# Altium integrated library 刘兴达Lib.IntLib: 614 symbols (part 4 of 4) (continued)
## TPS3305
designator U?, comment TPS3305-18D
DSP电源管理
footprint MSOP-8 (TSOP)
pins: 1 SE1, 2 SE2, 3 WDI, 4 GND, 5 ~{RESET}, 6 RESET, 7 ~{MR}, 8 VDD

## TPS3808
designator U?
DSP电源管理
footprint SOT23-6 (Max4173)
pins: 1 ~{RESET}, 2 GND, 3 ~{MR}, 4 CT, 5 SENSE, 6 VDD

## TPS5430
designator U?  (value not drawn)
开关稳压芯片
footprint POWERPARK SOP8
pins: 0 GND, 1 BOOT, 2 NC, 3 NC, 4 VSENSE, 5 ENA, 6 GND, 7 VIN, 8 PH

## TPS6213X
designator U?
DC-DC
footprint QFN-16 (QFN)
pins: 1 SW, 2 SW, 3 SW, 4 PG, 5 FB, 6 AGND, 7 FSW, 8 DEF, 9 SS/TR, 10 AVIN, 11 PVIN, 12 PVIN, 13 EN, 14 VOS, 15 PGND, 16 PGND, 17 PAD

## TPS6735
designator U?
负电压芯片
footprint SOIC-8
pins: 1 EN, 2 REF, 3 SS, 4 COMP, 5 FB, 6 GND, 7 OUT, 8 VCC

## TPS54160
designator U?
异步1.5A输出BUCK; Manufacturer_Part_Number: tps54160_dgq_10; GENERIC_PART_NUMBER: TPS54160; Vendor: Texas Instruments; PACKAGE_DESIGNATOR: DGQ; PIN_COUNT: 10; FAMILY_NAME: STEP-DOWN REGULATOR; INDUSTRY_STD_PKG_TYPE: MSOP-PowerPAD; Manufacturer: Texas Instruments; Datasheet_URL: http://www.ti.com/lit/gpn/TPS54160; Value: Value; Type: Type; RefDes: RefDes
footprint MSOP-10（with cooler）
pins: 1 BOOT (out), 2 VIN (in), 3 EN (in), 4 SS/TR (in), 5 RT/CLK (in), 6 PWRGD (out), 7 VSENSE (in), 8 COMP (out), 9 GND (power), 10 PH (in), EPAD

## TPS54360
designator U?
异步3A输出BUCK; Manufacturer_Part_Number: TPS54360DDAR; Vendor: Texas Instruments; Built_By: EMA_UL_Team; Copyright: Copyright (C) 2018 Accelerated Designs. All rights reserved; RefDes: RefDes; Type: DEV; Value: Value
footprint HSOIC8
pins: 1 BOOT (out), 2 VIN (in), 3 EN (in), 4 RT/CLK (in), 5 FB (in), 6 COMP (out), 7 GND (power), 8 SW (in), EPAD

## TPS55330
designator U?
升压
footprint QFN_16
pins: 1 SW, 2 VIN, 3 EN, 4 SS, 5 SYNC, 6 AGND, 7 COMP, 8 FB, 9 FREQ, 10 NC, 11 PGND, 12 PGND, 13 PGND, 14 NC, 15 SW, 16 SW, 17 PAD

## TPS61022
designator U?
0.5V 输入电压 8A 输出BOOST; Manufacturer: Texas Instruments; PartNumber: TPS61022RWUR; RefDes: RefDes; TYPE: TYPE; Value: Value
footprint VQFN-7
pins: 1 GND (power), 2 SW (power), 3 VOUT (power), 4 FB (in), 5 EN (in), 6 MODE (in), 7 VIN (power)

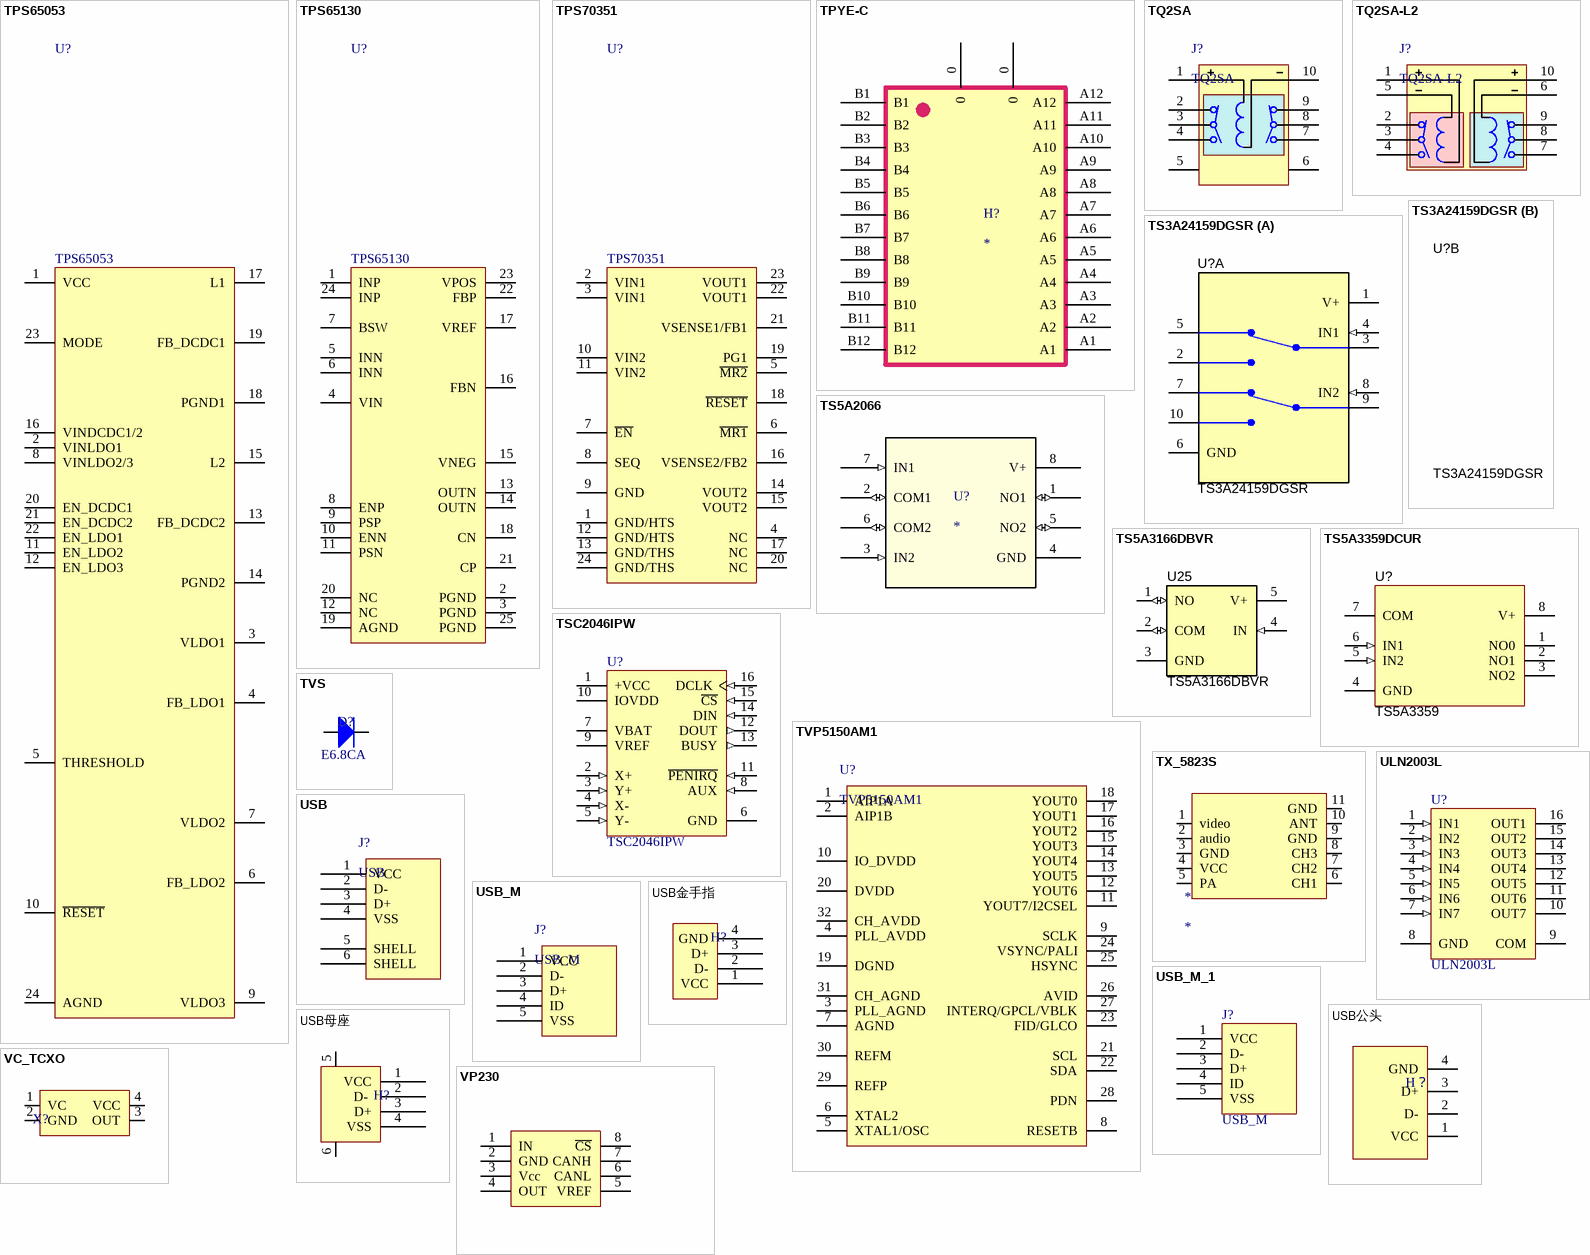
[diagram p27: symbols TPS65053 to VP230]

## TPS65053
designator U?
DSP电源芯片
footprint VQFN-24
pins: 1 VCC, 2 VINLDO1, 3 VLDO1, 4 FB_LDO1, 5 THRESHOLD, 6 FB_LDO2, 7 VLDO2, 8 VINLDO2/3, 9 VLDO3, 10 ~{RESET}, 11 EN_LDO2, 12 EN_LDO3, 13 FB_DCDC2, 14 PGND2, 15 L2, 16 VINDCDC1/2, 17 L1, 18 PGND1, 19 FB_DCDC1, 20 EN_DCDC1, 21 EN_DCDC2, 22 EN_LDO1, 23 MODE, 24 AGND, 25 GND hidden to GND

## TPS65130
designator U?
电源管理DC-DC
footprint VQFN-24
pins: 1 INP, 2 PGND, 3 PGND, 4 VIN, 5 INN, 6 INN, 7 BSW, 8 ENP, 9 PSP, 10 ENN, 11 PSN, 12 NC, 13 OUTN, 14 OUTN, 15 VNEG, 16 FBN, 17 VREF, 18 CN, 19 AGND, 20 NC, 21 CP, 22 FBP, 23 VPOS, 24 INP, 25 PGND

## TPS70351
designator U?
DSP电源芯片
footprint TSSOP-24P
pins: 1 GND/HTS, 2 VIN1, 3 VIN1, 4 NC, 5 ~{MR2}, 6 ~{MR1}, 7 ~{EN}, 8 SEQ, 9 GND, 10 VIN2, 11 VIN2, 12 GND/HTS, 13 GND/THS, 14 VOUT2, 15 VOUT2, 16 VSENSE2/FB2, 17 NC, 18 ~{RESET}, 19 PG1, 20 NC, 21 VSENSE1/FB1, 22 VOUT1, 23 VOUT1, 24 GND/THS, 25 GND hidden to GND

## TPYE-C
designator H?
footprint TYPE-C 24P
pins: 0, 0, A1, A2, A3, A4, A5, A6, A7, A8, A9, A10, A11, A12, B1, B2, B3, B4, B5, B6, B7, B8, B9, B10, B11, B12

## TQ2SA
designator J?
单通道继电器
footprint TQ2SA-SL (双继电器)
pins: 1, 2, 3, 4, 5, 6, 7, 8, 9, 10

## TQ2SA-L2
designator J?
双通道双稳态继电器
footprint TQ2SA-SL (双继电器)
pins: 1, 2, 3, 4, 5, 6, 7, 8, 9, 10

## TS3A24159DGSR
designator U?
模拟开关; PartNumber: TS3A24159DRCR; Manufacturer: Texas Instruments; SymbolCreator: Altium; SizeArea_mm2: 9; SizeAreaWB_mm2: 16; SizeX_mm: 3; SizeZ_mm: 1; CompType: IC; U/M: EA; SymbolVersion: 2016-05-18; PackageReference: DRC0010J; PackageDescription: VSON-10; MountType: SMT; SizeY_mm: 3; ComponentLink1Description: Datasheet Link; ComponentLink1URL: http://www.ti.com/lit/ds/symlink/ts3a24159.pdf; RoHS: Y; Publisher: Texas Instruments; LatestRevisionDate: 2016-08-29; Alternate Manufacturer: Texas Instruments
footprint MSOP-10 (TSSOP)
part A pins: 1 V+ (power), 2 NO1, 3 COM1, 4 IN1 (in), 5 NC1, 6 GND (power), 7 NC2, 8 IN2 (in), 9 COM2, 10 NO2

## TS5A2066
designator U?
PartNumber: TS5A2066DCUR; Manufacturer: Texas Instruments; RefDes: RefDes; Type: DEV; Value: Value; Copyright: Copyright (C) 2018 Accelerated Designs. All rights reserved
footprint VSSOP-8
pins: 1 NO1 (io), 2 COM1 (io), 3 IN2 (in), 4 GND (power), 5 NO2 (io), 6 COM2 (io), 7 IN1 (in), 8 V+ (power)

## TS5A3166DBVR
designator U25
模拟开关; PartNumber: TS5A3166DCKR; Manufacturer: Texas Instruments; SymbolCreator: x0208325; SizeArea_mm2: 4.2; SizeX_mm: 2.1; SizeY_mm: 2; SizeZ_mm: 1.1; CompType: IC; U/M: EA; SymbolVersion: 2016-1-28; PackageReference: DCK0005A; PackageDescription: SOT-5; MountType: SMT; ComponentLink1Description: Datasheet Link; ComponentLink1URL: http://www.ti.com/lit/ds/symlink/ts5a3166.pdf; RoHS: Y; Publisher: Texas Instruments; LatestRevisionDate: 2016-05-13; Alternate Manufacturer: Texas Instruments
footprint SOT23-5 (Max4173)
pins: 1 NO (io), 2 COM (io), 3 GND (power), 4 IN (in), 5 V+ (power)

## TS5A3359DCUR
designator U?, comment TS5A3359
模拟开关; PartNumber: TS5A3359DCUR; Alternate PartNumber: TS5A3359DCUT; Manufacturer: Texas Instruments; SymbolCreator: Altium; CompType: IC; U/M: EA; SymbolVersion: 2015-03-25; PackageReference: DCU0008A; MountType: SMT; ComponentLink1Description: Datasheet Link; ComponentLink1URL: http://www.ti.com/lit/ds/symlink/ts5a3359.pdf; RoHS: Y; Publisher: Texas Instruments; LatestRevisionDate: 2015-12-28; Alternate Manufacturer: Texas Instruments
footprint VSSOP-8
pins: 1 NO0, 2 NO1, 3 NO2, 4 GND (power), 5 IN2 (in), 6 IN1 (in), 7 COM, 8 V+ (power)

## TSC2046IPW
designator U?
触摸驱动芯片; Published: 6-Oct-2005; DatasheetVersion: Jan-2005; PackageVersion: Feb-1999; PackageReference: PW016; Publisher: Altium Limited; PackageDescription: Shrink Small Outline; 16 Leads; Body Width 4.4 mm; Pitch 0.65 mm; ComponentLink1Description: Manufacturer Link; ComponentLink1URL: http://focus.ti.com/docs/prod/folders/print/tsc2046.html; ComponentLink2Description: Datasheet; ComponentLink2URL: http://focus.ti.com/lit/ds/symlink/tcs2046.pdf
footprint PW016 (Shrink Small Outline; 16 Leads; Body Width 4.4 mm; Pitch 0.65 mm)
pins: 1 +VCC (power), 2 X+ (in), 3 Y+ (in), 4 X- (in), 5 Y- (in), 6 GND (power), 7 VBAT (power), 8 AUX (in), 9 VREF (power), 10 IOVDD (power), 11 ~{PENIRQ} (in), 12 DOUT (out), 13 BUSY (out), 14 DIN (in), 15 ~{CS} (in), 16 DCLK (in)

## TVP5150AM1
designator U?
视频解码芯片
footprint TQFP-32
pins: 1 AIP1A, 2 AIP1B, 3 PLL_AGND, 4 PLL_AVDD, 5 XTAL1/OSC, 6 XTAL2, 7 AGND, 8 RESETB, 9 SCLK, 10 IO_DVDD, 11 YOUT7/I2CSEL, 12 YOUT6, 13 YOUT5, 14 YOUT4, 15 YOUT3, 16 YOUT2, 17 YOUT1, 18 YOUT0, 19 DGND, 20 DVDD, 21 SCL, 22 SDA, 23 FID/GLCO, 24 VSYNC/PALI, 25 HSYNC, 26 AVID, 27 INTERQ/GPCL/VBLK, 28 PDN, 29 REFP, 30 REFM, 31 CH_AGND, 32 CH_AVDD

## TVS
designator D?  Type: E6.8CA  (hidden comment: TVS)
TVS保护; Published: 8-Jun-2000; LatestRevisionDate: 17-Jul-2002; LatestRevisionNote: Re-released for DXP Platform.; PackageDocument: Sep-1996; PackageReference: SMC; Publisher: Altium Limited; Code_JEDEC: DO-214-AB
footprint D-AXL (插件二极管)
footprint D-1206 (贴片二极管)
footprint D-SMA (贴片二极管)
footprint D-SMB (DO-214-AA/SMB; 2 C-Bend Leads; Body 5.3 x 3.6 mm, inc. leads (LxW))
pins: 1 A, 2 K

## TX_5823S
designator *
footprint TX_5823S (图传发射芯片)
pins: 1 video, 2 audio, 3 GND, 4 VCC, 5 PA, 6 CH1, 7 CH2, 8 CH3, 9 GND, 10 ANT, 11 GND

## ULN2003L
designator U?
驱动芯片; Published: 13-Oct-2000; LatestRevisionDate: 13-Apr-2006; LatestRevisionNote: IPC-7351 Footprint Added.; DatasheetVersion: 1998; PackageReference: L16; Publisher: Altium Limited; PackageDescription: 16-Pin Small Outline Integrated Circuit 1.27 mm Pitch; Code_JEDEC: MS-012-AC; Code_IPC: SOIC127P600-16; ComponentLink1Description: Manufacturer Link; ComponentLink1URL: http://www.allegromicro.com/
footprint SOIC-16
pins: 1 IN1 (in), 2 IN2 (in), 3 IN3 (in), 4 IN4 (in), 5 IN5 (in), 6 IN6 (in), 7 IN7 (in), 8 GND (power), 9 COM, 10 OUT7 (oc), 11 OUT6 (oc), 12 OUT5 (oc), 13 OUT4 (oc), 14 OUT3 (oc), 15 OUT2 (oc), 16 OUT1 (oc)

## USB
designator J?
USB接口
footprint USB_B1 (USB方孔)
footprint USB_A1
footprint USB_C1 (侧卧USB)
pins: 1 VCC, 2 D- , 3 D+, 4 VSS, 5 SHELL, 6 SHELL

## USB_M
designator J?
Micro/Mini USB
footprint USB_MICRO (USB方孔)
footprint USB/SM0.8-6H5 (Connector; USB2.0, Type B, SM; 5 Position; Right Angle)
pins: 1 VCC, 2 D- , 3 D+, 4 ID, 5 VSS

## USB_M_1
designator J?, comment USB_M
Micro/Mini USB
footprint MINI-USB-SMD_C105424
pins: 1 VCC, 2 D- , 3 D+, 4 ID, 5 VSS

## USB公头
designator H？  (value not drawn)
footprint USB公头
pins: 1 VCC, 2 D-, 3 D+, 4 GND

## USB母座
designator H?  (value not drawn)
footprint USB母座
footprint USB母座B
pins: 1 VCC, 2 D- , 3 D+, 4 VSS, 5, 6

## USB金手指
designator H?  (value not drawn)
footprint USB金手指
pins: 1 VCC, 2 D-, 3 D+, 4 GND

## VC_TCXO
designator X?
温控晶振
footprint OSC-5032-4P (5mm*3.2mm*0.8mm(长*宽*高)              淘宝ID:黄晶宝石)
pins: 1 VC, 2 GND, 3 OUT, 4 VCC

## VP230
designator U?  (value not drawn)
CAN 芯片
footprint VP230
pins: 1 IN, 2 GND, 3 Vcc, 4 OUT, 5 VREF, 6 CANL, 7 CANH, 8 ~{CS}

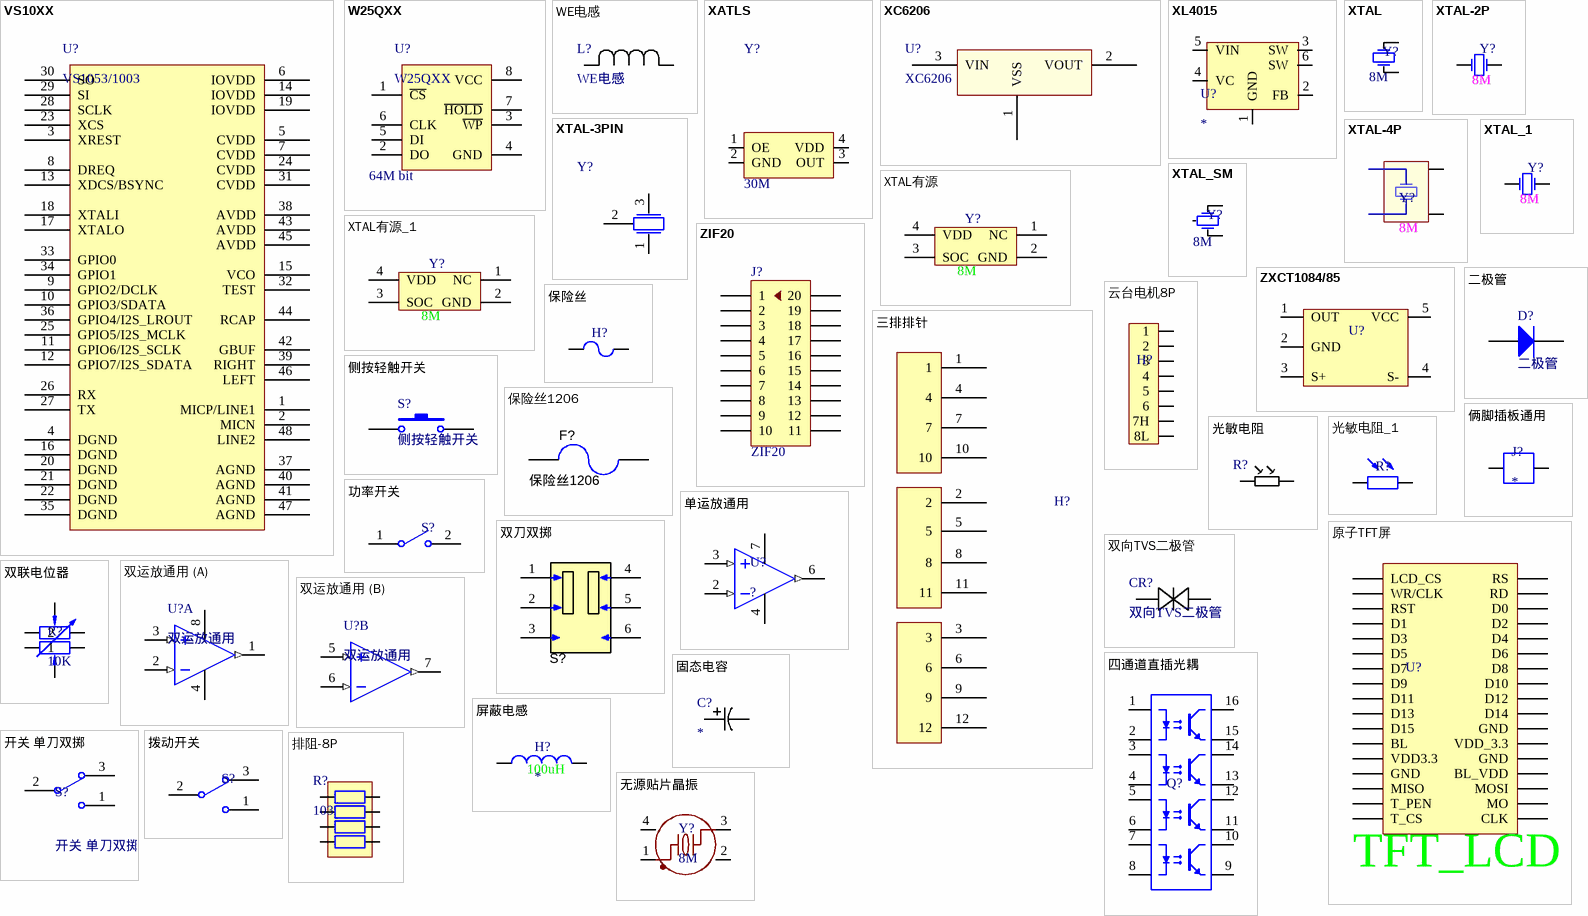
[diagram p28: symbols VS10XX to 无源贴片晶振]

## VS10XX
designator U?, comment VS1053/1003
音频解码芯片
footprint LQFP-48 (LQFP)
pins: 1 MICP/LINE1, 2 MICN, 3 XREST, 4 DGND, 5 CVDD, 6 IOVDD, 7 CVDD, 8 DREQ, 9 GPIO2/DCLK, 10 GPIO3/SDATA, 11 GPIO6/I2S_SCLK, 12 GPIO7/I2S_SDATA, 13 XDCS/BSYNC, 14 IOVDD, 15 VCO, 16 DGND, 17 XTALO, 18 XTALI, 19 IOVDD, 20 DGND, 21 DGND, 22 DGND, 23 XCS, 24 CVDD, 25 GPIO5/I2S_MCLK, 26 RX, 27 TX, 28 SCLK, 29 SI, 30 SO, 31 CVDD, 32 TEST, 33 GPIO0, 34 GPIO1, 35 DGND, 36 GPIO4/I2S_LROUT, 37 AGND, 38 AVDD, 39 RIGHT, 40 AGND, 41 AGND, 42 GBUF, 43 AVDD, 44 RCAP, 45 AVDD, 46 LEFT, 47 AGND, 48 LINE2

## W25QXX
designator U?  Memory: 64M bit
SPI FLASH
footprint SOIC-8W (SPI_FLASH)
pins: 1 ~{CS}, 2 DO, 3 ~{WP}, 4 GND, 5 DI, 6 CLK, 7 ~{HOLD}, 8 VCC

## WE电感
designator L?
Manufacturer_Part_Number: 744325240; Vendor: Wurth Electronics; Built_By: EMA_UL_Team; Type: DEV; Copyright: Copyright (C) 2018 Accelerated Designs. All rights reserved; RefDes: RefDes; Value: Value
footprint WE1050
pins: 1, 2

## XATLS
designator Y?  value 30M  (hidden comment: XATLS)
贴片有源晶振
footprint X-CPX75
pins: 1 OE, 2 GND, 3 OUT, 4 VDD

## XC6206
designator U?
Manufacturer_Part_Number: XC6206P502MR; Vendor: Torex Semiconductor; Built_By: EMA_UL_Team; Copyright: Copyright (C) 2018 Accelerated Designs. All rights reserved; RefDes: RefDes; Type: DEV; Value: Value
footprint SOT-23-3
pins: 1 VSS, 2 VOUT, 3 VIN (power)

## XL4015
designator U?
舵机稳压开关电源
footprint TO263_5L
pins: 1 GND, 2 FB, 3 SW, 4 VC, 5 VIN, 6 SW

## XTAL
designator Y?  value 8M  (hidden comment: XTAL)
晶振; Published: 8-Jun-2000; LatestRevisionDate: 17-Jul-2002; LatestRevisionNote: Re-released for DXP Platform.; PackageReference: R38; Publisher: Altium Limited
footprint X-HC-49S (插件晶振)
footprint X-SM49
pins: 1 OSC1, 2 OSC2

## XTAL-2P
designator Y?  (value not drawn)
无源晶振
footprint XTAL-5032_2P
pins: 1 OSC1, 2 OSC2
text: 8M

## XTAL-3PIN
designator Y?  (value not drawn)
贴片晶振
footprint X-CPX20 (贴片晶振)
pins: 1, 2, 3

## XTAL-4P
designator Y?  (value not drawn)
无源晶振
footprint XTAL-5032_4P
footprint XTAL-3225_4P
pins: 1 OSC1, 2 GND, 3 OSC2, 4 GND
text: 8M

## XTAL_1
designator Y?  (value not drawn)
晶振
footprint XTAL
pins: 1 OSC1, 2 OSC2
text: 8M

## XTAL_SM
designator Y?  value 8M  (hidden comment: XTAL_SM)
圆柱晶振; Published: 8-Jun-2000; LatestRevisionDate: 17-Jul-2002; LatestRevisionNote: Re-released for DXP Platform.; PackageReference: R38; Publisher: Altium Limited
footprint X-TC15 (圆柱晶振1)
footprint X-TC26 (圆柱晶振2)
pins: 1 OSC1, 2 OSC2, 3

## XTAL有源
designator Y?  (value not drawn)
晶振
footprint XTAL有源
pins: 1 NC, 2 GND, 3 SOC, 4 VDD
text: 8M

## XTAL有源_1
designator Y?  (value not drawn)
晶振
footprint 7050
pins: 1 NC, 2 GND, 3 SOC, 4 VDD
text: 8M

## ZIF20
designator J?
接插件; LatestRevisionDate: 17-Jul-2002; LatestRevisionNote: Re-released for DXP Platform.; Publisher: Altium Limited
footprint ZIF20
pins: 1, 2, 3, 4, 5, 6, 7, 8, 9, 10, 11, 12, 13, 14, 15, 16, 17, 18, 19, 20

## ZXCT1084/85
designator U?  (value not drawn)
高端电流采样
footprint SOT25
pins: 1 OUT, 2 GND, 3 S+, 4 S-, 5 VCC

## 三排排针
designator H?  (value not drawn)
footprint 三排排针
pins: 1, 2, 3, 4, 5, 6, 7, 8, 9, 10, 11, 12

## 二极管
designator D?
Published: 8-Jun-2000; LatestRevisionDate: 17-Jul-2002; LatestRevisionNote: Re-released for DXP Platform.; PackageReference: DIODE-0.7; Publisher: Altium Limited; PackageDescription: Diode, Thru-Hole; 2 Leads; 0.7 in Pin Spacing
footprint SOD-523
footprint SOD-123
footprint DO-0603
pins: 1 A, 2 K

## 云台电机8P
designator H?  (value not drawn)
footprint 云台电机8P
pins: 1, 2, 3, 4, 5, 6, 7 7H, 8 8L

## 侧按轻触开关
designator S?
微动开关; Published: 24-Mar-1999; LatestRevisionDate: 17-Jul-2002; LatestRevisionNote: Re-released for DXP Platform.; PackageReference: SPST-2; Publisher: Altium Limited
footprint 侧按轻触开关1
pins: 1, 2

## 保险丝
designator H?  (value not drawn)
footprint 保险丝
pins: 1, 2

## 保险丝1206
designator F?
保险丝; PartNumber: NANOSMDC020F-2; Manufacturer: TE Connectivity; CompType: Fuse; VDC_V: 24; Rtyp_Ohm: 1.875; SymbolCreator: a0412235; SymbolVersion: 2013-04-02; PackageReference: 1206; MountType: SMT; RoHS: Y; Published: 2009-03-05; Publisher: Texas Instruments; LatestRevisionDate: 2015-11-23; ComponentLink1Description: Datasheet URL; ComponentLink1URL: http://www.te.com/commerce/DocumentDelivery/DDEController?Action=srchrtrv&DocNm=SCD25536&DocType=Customer+Drawing&DocLang=English; Supplier 1: Digi-Key; Supplier Part Number 1: NANOSMDC020F-2CT-ND; Supplier 2: Mouser; Supplier Part Number 2: 650-NANOSMDC020F-2; Supplier 3: Farnell; Supplier Part Number 3: 1345939
footprint 1206
pins: 1, 2

## 俩脚插板通用
designator J?
插板
footprint 插板用两脚
pins: 1, 2

## 光敏电阻
designator R?
Manufacturer_Part_Number: ERJ-6GEYJ335V; Vendor: Panasonic; Built_By: EMA_UL_Team; Copyright: Copyright (C) 2018 Accelerated Designs. All rights reserved; RefDes: RefDes; Type: DEV; Value: Value
footprint 光敏电阻
pins: 1, 2

## 光敏电阻_1
designator R?  (value not drawn)
footprint 光敏
pins: 1, 2

## 功率开关
designator S?  (value not drawn)
footprint 船型开关
pins: 1, 2

## 单运放通用
designator U?, comment ?
footprint SOIC-8
pins: 2 IN- (in), 3 IN+ (in), 4 V-, 6 OUT (out), 7 V+

## 原子TFT屏
designator U?  (value not drawn)
footprint Header17*2
pins: 1 LCD_CS, 2 RS, 3 WR/CLK, 4 RD, 5 RST, 6 D0, 7 D1, 8 D2, 9 D3, 10 D4, 11 D5, 12 D6, 13 D7, 14 D8, 15 D9, 16 D10, 17 D11, 18 D12, 19 D13, 20 D14, 21 D15, 22 GND, 23 BL, 24 VDD_3.3, 25 VDD3.3, 26 GND, 27 GND, 28 BL_VDD, 29 MISO, 30 MOSI, 31 T_PEN, 32 MO, 33 T_CS, 34 CLK
text: TFT_LCD

## 双刀双掷
designator S?  (value not drawn)
PartNumber: GS-113-0043; Manufacturer: CW Industries; SymbolCreator: x0208325; Circuit: DPDT; VDC_V: 125; SwitchFunction: On-On; PositionCount: 2; CurrentRating_mA: 500; CompType: Switch; SymbolVersion: 2016-1-28; MountType: TH; ComponentLink1Description: Datasheet Link; ComponentLink1URL: http://switches-connectors-custom.cwind.com/Asset/GS-113-0043-Dimension-drawing.pdf; RoHS: Y; Orientation: Top Actuated; PackageReference: 9.65x7.92mm; Publisher: Texas Instruments; LatestRevisionDate: 2016-05-10; Supplier 1: Digi-Key; Supplier Part Number 1: CWI421-ND; Supplier 2: Mouser; Supplier Part Number 2: 629-GS-113-0043
footprint 双联船型开关
pins: 1, 2 C, 3, 4, 5 C, 6

## 双向TVS二极管
designator CR?
Manufacturer_Part_Number: SM6T15CA; Vendor: STMicroelectronics; Built_By: EMA_UL_Team; Type: DEV; Copyright: Copyright (C) 2018 Accelerated Designs. All rights reserved; RefDes: RefDes; Value: Value
footprint DO-214AB
pins: 1, 2

## 双联电位器
designator R?, comment 10K
封装通孔画小了
footprint 双联电位器
pins: 1, 2, 3 1, 4 2, 5 2, 6 3

## 双运放通用
designator U?
双运放
footprint SOIC-8
part A pins: 1 OUT (out), 2 IN- (in), 3 IN+ (in), 4 V-, 8 V+
part B pins: 5 IN+ (in), 6 IN- (in), 7 OUT (out)

## 四通道直插光耦
designator Q?  (value not drawn)
footprint 四路直插光耦
pins: 1 A "Anode", 2 K "Cathode", 3 A "Anode", 4 K "Cathode", 5 A "Anode", 6 K "Cathode", 7 A "Anode", 8 K "Cathode", 9 E "Emitter", 10 C "Collector", 11 E "Emitter", 12 C "Collector", 13 E "Emitter", 14 C "Collector", 15 E "Emitter", 16 C "Collector"

## 固态电容
designator C?
Manufacturer_Part_Number: 16SEPC470M; Vendor: Panasonic; Built_By: EMA_UL_Team; Type: DEV; C: Copyright (C) 2015 Accelerated Designs. All rights reserved; RefDes: RefDes; Value: Value
footprint PCAP-5.54mm
footprint PCAP-7.62mm
footprint Panasonic F13
pins: 1, 2

## 屏蔽电感
designator H?
footprint 屏蔽7.2*7.2
footprint 屏蔽10*10
pins: 1, 2
text: 100uH

## 开关 单刀双掷
designator S?
单刀双掷开关; Published: 24-Mar-1999; LatestRevisionDate: 17-Dec-2003; LatestRevisionNote: Schematic revised, PCB Footprint replaced.; DatasheetDocument: 05-Dec-2000; PackageReference: TL36WW15050; Publisher: Altium Limited; ComponentLink1Description: Manufacturer Link; ComponentLink1URL: http://www.apem.com
footprint 单刀双掷开关2.5mm
pins: 1, 2, 3

## 拨动开关
designator S?  (value not drawn)
扭子拨动开关
footprint 拨动开关 (扭子拨动开关)
pins: 1, 2, 3

## 排阻-8P
designator R?, comment 103
贴片网络排阻; 版权归属: 源创客; BOM名称: 贴片网络排阻; 学习资源: www.ooocke.com
footprint 排阻8P-0603 (3.2mm*1.6mm*0.6mm(长*宽*厚))
footprint 排阻8P-0402 (2mm*1mm*0.45mm(长*宽*厚))
pins: 1, 2, 3, 4, 5, 6, 7, 8

## 无源贴片晶振
designator Y?, comment 8M
footprint OSC-SMD_4P-L3.2-W2.5-BL
pins: 1, 2 GND, 3, 4 GND

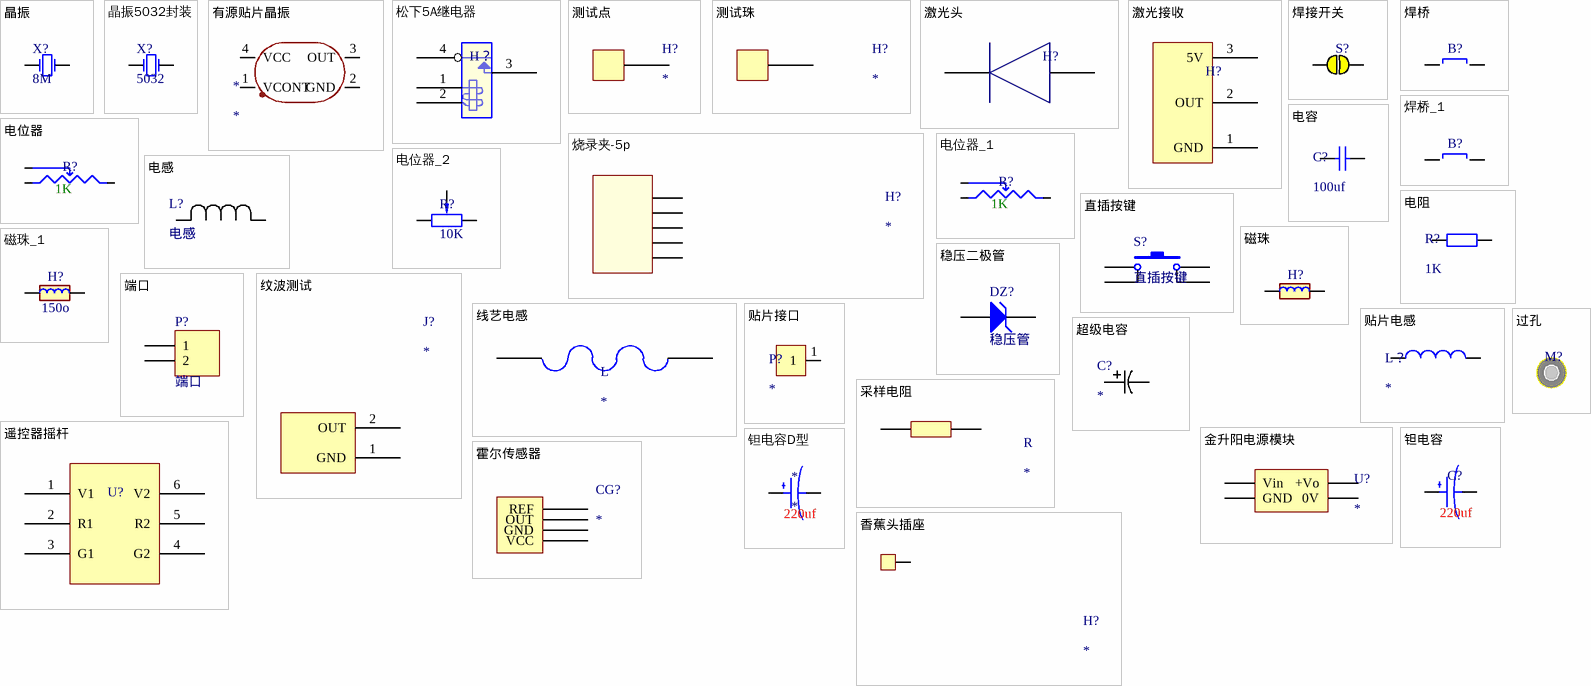
[diagram p29: symbols 晶振 to 香蕉头插座]

## 晶振
designator X?, comment 8M
HC-49S
footprint X-HC-49S (插件晶振)
pins: 1 OSC1, 2 OSC2

## 晶振5032封装
designator X?, comment 5032
pins: 1 OSC1, 2 OSC2

## 有源贴片晶振
designator *
footprint OSC-SMD_4P-L3.2-W2.5-BL
pins: 1 VCONT, 2 GND, 3 OUT, 4 VCC

## 松下5A继电器
designator H？  (value not drawn)
footprint 松下5A继电器
pins: 1 COIL1, 2 COIL2, 3 NO, 4 COMMON

## 测试点
designator H?
footprint 测试焊盘 1.5*3
pins: 1

## 测试珠
designator H?
footprint 测试珠0.1
footprint 测试环
pins: 1

## 激光头
designator H?  (value not drawn)
footprint 激光头
pins: 1, 2

## 激光接收
designator H?  (value not drawn)
footprint 激光接收
pins: 1 GND, 2 OUT, 3 5V

## 烧录夹-5p
designator H?
footprint 烧录夹-5p-2mm
pins: 1, 2, 3, 4, 5

## 焊接开关
designator S?  (value not drawn)
footprint 焊接开关
pins: 0, 1

## 焊桥
designator B?  (value not drawn)
0805
footprint 0805-1 (0805带丝印)
pins: 1, 2

## 焊桥_1
designator B?  (value not drawn)
0603
footprint 0603-1 (0603带丝印)
pins: 1, 2

## 电位器
designator R?  (value not drawn)
footprint 电位器
pins: 1, 2, 3
text: 1K

## 电位器_1
designator R?  (value not drawn)
footprint 0932电位器
pins: 1, 2, 3
text: 1K

## 电位器_2
designator R?, comment 10K
footprint 电位器
pins: 1, 2, 3

## 电容
designator C?, comment 100uf
电容
footprint CAP0603
footprint CAP0805
footprint CAP1206
footprint CAP1210
footprint CAP1812
footprint CAP2010
footprint CAP2220
footprint CAP0402
footprint CAP0201 (贴片MLCC电容-无丝印)
pins: 1, 2

## 电感
designator L?
Manufacturer_Part_Number: 744325240; Vendor: Wurth Electronics; Built_By: EMA_UL_Team; Type: DEV; Copyright: Copyright (C) 2018 Accelerated Designs. All rights reserved; RefDes: RefDes; Value: Value
footprint L-3012
footprint 直插电感（李兹线）
pins: 1, 2

## 电阻
designator R?, comment 1K
footprint R0805
footprint R0603
footprint 直插电阻
footprint R0402
footprint R1206
footprint R1632
footprint R2010
footprint R0201 (1/20W贴片电阻)
pins: 1, 2

## 直插按键
designator S?
微动开关
footprint Switch 6*6
pins: 1, 2 4, 3, 4 2

## 磁珠
designator H?  (value not drawn)
footprint 磁珠
pins: 1, 2

## 磁珠_1
designator H?  (value not drawn)
footprint L-1806
pins: 1, 2
text: 150o

## 稳压二极管
designator DZ?, comment 稳压管
Published: 8-Jun-2000; LatestRevisionDate: 17-Jul-2002; LatestRevisionNote: Re-released for DXP Platform.; PackageReference: DIODE-0.7; Publisher: Altium Limited; PackageDescription: Diode, Thru-Hole; 2 Leads; 0.7 in Pin Spacing
footprint DO-219AB
pins: 1 A, 2 K

## 端口
designator P?
Header, 2-Pin; LatestRevisionDate: 17-Jul-2002; LatestRevisionNote: Re-released for DXP Platform.; Publisher: Altium Limited
footprint CONN-TH_WJ126V-5.0-2P
pins: 1, 2

## 纹波测试
designator J?
footprint 纹波测试
pins: 1 GND, 2 OUT

## 线艺电感
designator L
footprint XAL4020
footprint SER2900
footprint XFL3012
footprint XAL6060
footprint XAL5050
footprint XAL1510
pins: 1, 2

## 贴片接口
designator P?
footprint 贴片接口
pins: 1

## 贴片电感
designator L？
footprint L_7.2*7.2
footprint L_10*10
footprint L_12*12
pins: 1, 2

## 超级电容
designator C?
Manufacturer_Part_Number: 16SEPC470M; Vendor: Panasonic; Built_By: EMA_UL_Team; Type: DEV; C: Copyright (C) 2015 Accelerated Designs. All rights reserved; RefDes: RefDes; Value: Value
footprint SuperCap 10mm 22mm
pins: 1, 2

## 过孔
designator M?  (value not drawn)
footprint M3过孔

## 遥控器摇杆
designator U?  (value not drawn)
摇杆
footprint 遥控器摇杆 (摇杆)
pins: 1 V1, 2 R1, 3 G1, 4 G2, 5 R2, 6 V2

## 采样电阻
designator R
footprint RES 2512
footprint 采样电阻TO-220
footprint R1632
footprint RES_FCSL76
pins: 1, 2

## 金升阳电源模块
designator U?
footprint IB_S-2W
pins: 1 Vin, 2 GND, 3 0V, 4 +Vo

## 钽电容
designator C?  value 220uf  (hidden comment: *)
footprint TAN-A-3216
footprint TAN-B-3528
footprint TAN-C-6032
footprint TAN-D-7343
footprint TAN-E-7343
pins: 1, 2

## 钽电容D型
designator *
footprint 钽电容D型
pins: 1, 2
text: 220uf

## 霍尔传感器
designator CG?
footprint HCS-ES5
pins: 1 REF, 2 OUT, 3 GND, 4 VCC

## 香蕉头插座
designator H?
footprint 香蕉头过孔
footprint 6mm 8mm
pins: 1